# Altium footprint library Samtec PC104 Plus.PcbLib: 38 footprints (part 2 of 3)
Each footprint in its own frame and in the unit in brackets; x right, y up, seen from the top. Pads: shape width x height; smd on the part's side, far side on the other; paste and mask are expansions set on the pad; w line width, h text height; cw(c..) or ccw(c..) is an arc to the next point about the centre after c.
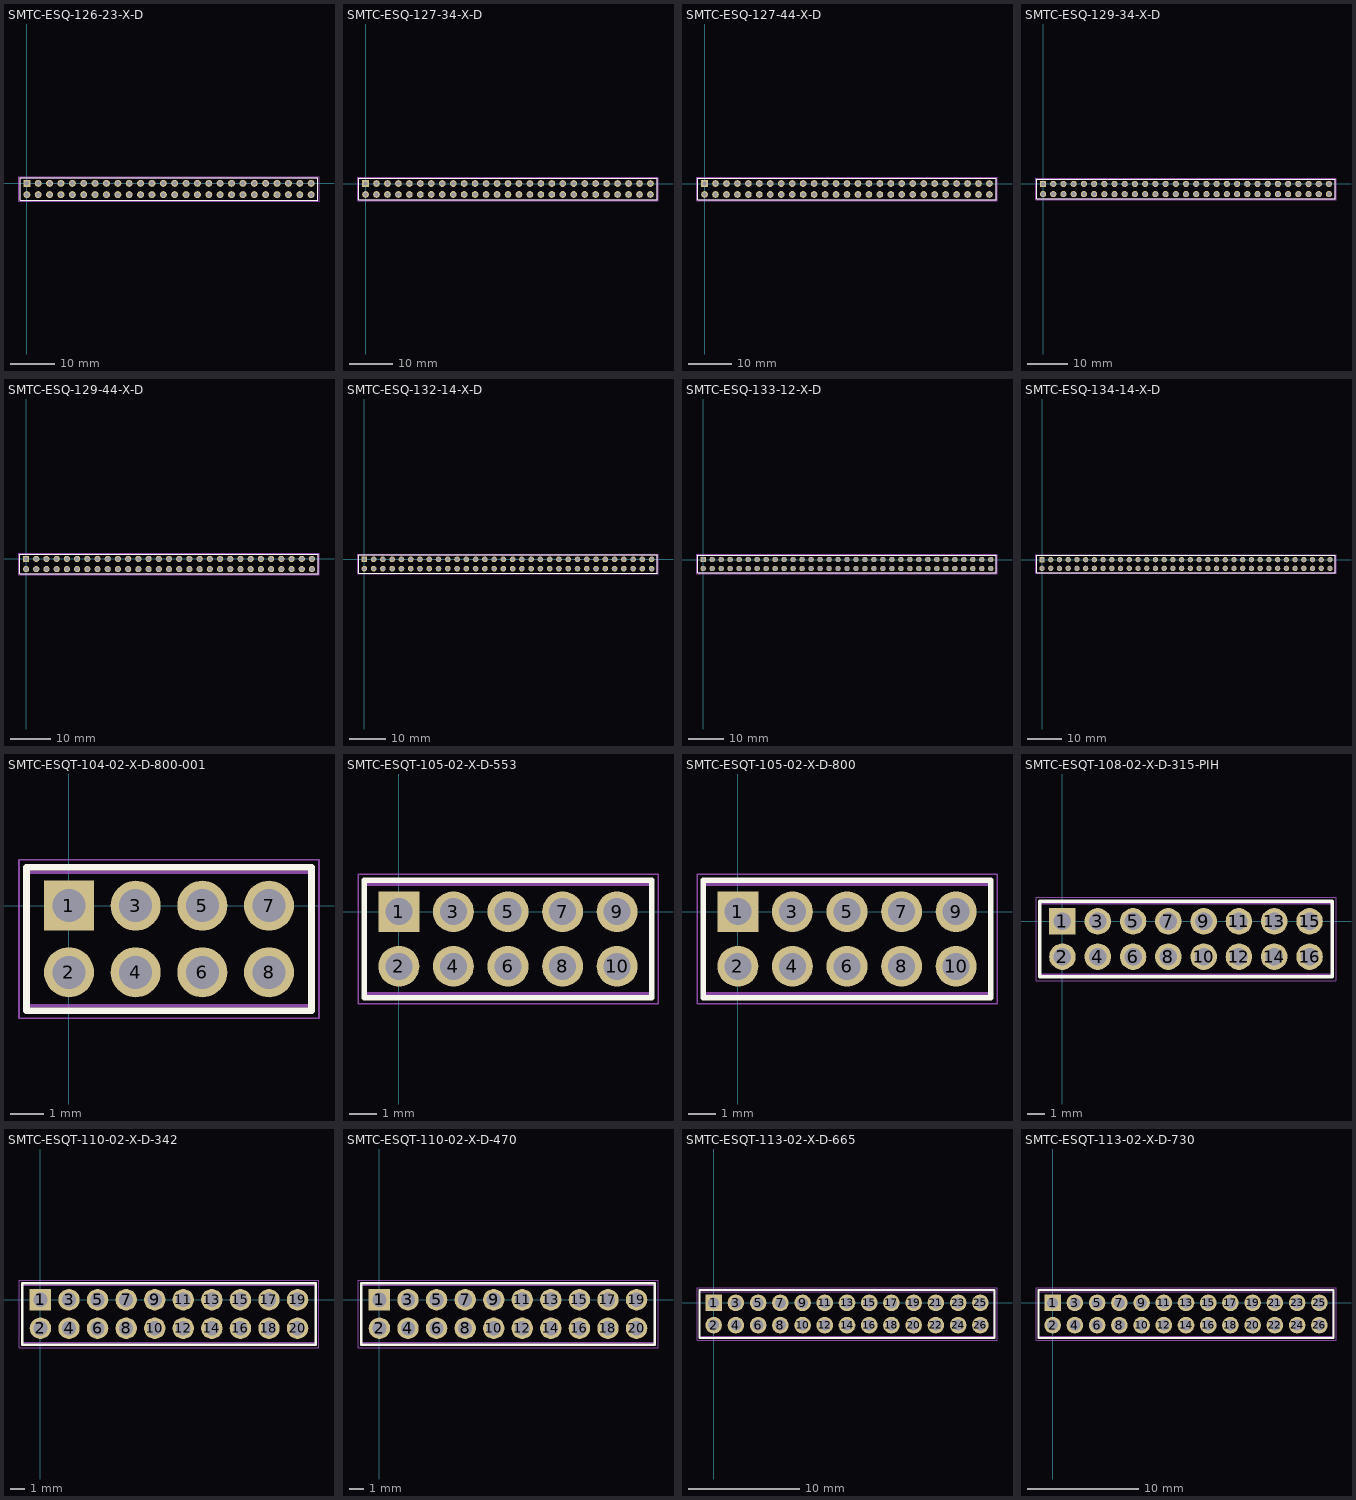
[diagram p1: the footprints below, top view; thin cyan lines are the x and y axes]

## SMTC-ESQ-126-23-X-D [mm] "Elevated Socket, 2x26 Pins, Vertical, 2.54mm Pitch, Female"
height 13.843
pads (52):
  rect 1.55x1.55 hole 1.02: 1(0,0)
  round 1.55 hole 1.02: 2(0,-2.54) 3(2.54,0) 4(2.54,-2.54) 5(5.08,0) 6(5.08,-2.54) 7(7.62,0) 8(7.62,-2.54) 9(10.16,0) 10(10.16,-2.54) 11(12.7,0) 12(12.7,-2.54) 13(15.24,0) 14(15.24,-2.54) 15(17.78,0) 16(17.78,-2.54) 17(20.32,0) 18(20.32,-2.54) 19(22.86,0) 20(22.86,-2.54) 21(25.4,0) 22(25.4,-2.54) 23(27.94,0) 24(27.94,-2.54) 25(30.48,0) 26(30.48,-2.54) 27(33.02,0) 28(33.02,-2.54) 29(35.56,0) 30(35.56,-2.54) 31(38.1,0) 32(38.1,-2.54) 33(40.64,0) 34(40.64,-2.54) 35(43.18,0) 36(43.18,-2.54) 37(45.72,0) 38(45.72,-2.54) 39(48.26,0) 40(48.26,-2.54) 41(50.8,0) 42(50.8,-2.54) 43(53.34,0) 44(53.34,-2.54) 45(55.88,0) 46(55.88,-2.54) 47(58.42,0) 48(58.42,-2.54) 49(60.96,0) 50(60.96,-2.54) 51(63.5,0) 52(63.5,-2.54)
Top Overlay:
  lines w0.2: -1.525,-3.745 65.025,-3.745 65.025,1.205 -1.525,1.205 -1.525,-3.745
Mechanical 13:
  lines w0.1: -1.525,-3.745 -1.525,1.205 65.025,1.205 65.025,-3.745 -1.525,-3.745
Mechanical 15:
  lines w0.05: -1.75,-3.97 65.25,-3.97 65.25,1.43 -1.75,1.43 -1.75,-3.97
3D body "ESQ-126-23-X-D.step": height 13.84, standoff -4.83, extent -1.525,-3.81 65.023,1.27

## SMTC-ESQ-127-34-X-D [mm] "Elevated Socket, 2x27 Pins, Vertical, 2.54mm Pitch, Female"
height 16.383
pads (54):
  rect 1.55x1.55 hole 1.02: 1(0,0)
  round 1.55 hole 1.02: 2(0,-2.54) 3(2.54,0) 4(2.54,-2.54) 5(5.08,0) 6(5.08,-2.54) 7(7.62,0) 8(7.62,-2.54) 9(10.16,0) 10(10.16,-2.54) 11(12.7,0) 12(12.7,-2.54) 13(15.24,0) 14(15.24,-2.54) 15(17.78,0) 16(17.78,-2.54) 17(20.32,0) 18(20.32,-2.54) 19(22.86,0) 20(22.86,-2.54) 21(25.4,0) 22(25.4,-2.54) 23(27.94,0) 24(27.94,-2.54) 25(30.48,0) 26(30.48,-2.54) 27(33.02,0) 28(33.02,-2.54) 29(35.56,0) 30(35.56,-2.54) 31(38.1,0) 32(38.1,-2.54) 33(40.64,0) 34(40.64,-2.54) 35(43.18,0) 36(43.18,-2.54) 37(45.72,0) 38(45.72,-2.54) 39(48.26,0) 40(48.26,-2.54) 41(50.8,0) 42(50.8,-2.54) 43(53.34,0) 44(53.34,-2.54) 45(55.88,0) 46(55.88,-2.54) 47(58.42,0) 48(58.42,-2.54) 49(60.96,0) 50(60.96,-2.54) 51(63.5,0) 52(63.5,-2.54) 53(66.04,0) 54(66.04,-2.54)
Top Overlay:
  lines w0.2: -1.525,-3.745 -1.525,1.205 67.565,1.205 67.565,-3.745 -1.525,-3.745
Mechanical 13:
  lines w0.1: -1.525,-3.745 67.565,-3.745 67.565,1.205 -1.525,1.205 -1.525,-3.745
Mechanical 15:
  lines w0.05: -1.75,-3.97 67.79,-3.97 67.79,1.43 -1.75,1.43 -1.75,-3.97
3D body "ESQ-127-34-X-D.step": height 16.38, standoff -7.11, extent -1.524,-3.81 67.564,1.27

## SMTC-ESQ-127-44-X-D [mm] "Elevated Socket, 2x27 Pins, Vertical, 2.54mm Pitch, Female"
height 18.923
pads (54):
  rect 1.55x1.55 hole 1.02: 1(0,0)
  round 1.55 hole 1.02: 2(0,-2.54) 3(2.54,0) 4(2.54,-2.54) 5(5.08,0) 6(5.08,-2.54) 7(7.62,0) 8(7.62,-2.54) 9(10.16,0) 10(10.16,-2.54) 11(12.7,0) 12(12.7,-2.54) 13(15.24,0) 14(15.24,-2.54) 15(17.78,0) 16(17.78,-2.54) 17(20.32,0) 18(20.32,-2.54) 19(22.86,0) 20(22.86,-2.54) 21(25.4,0) 22(25.4,-2.54) 23(27.94,0) 24(27.94,-2.54) 25(30.48,0) 26(30.48,-2.54) 27(33.02,0) 28(33.02,-2.54) 29(35.56,0) 30(35.56,-2.54) 31(38.1,0) 32(38.1,-2.54) 33(40.64,0) 34(40.64,-2.54) 35(43.18,0) 36(43.18,-2.54) 37(45.72,0) 38(45.72,-2.54) 39(48.26,0) 40(48.26,-2.54) 41(50.8,0) 42(50.8,-2.54) 43(53.34,0) 44(53.34,-2.54) 45(55.88,0) 46(55.88,-2.54) 47(58.42,0) 48(58.42,-2.54) 49(60.96,0) 50(60.96,-2.54) 51(63.5,0) 52(63.5,-2.54) 53(66.04,0) 54(66.04,-2.54)
Top Overlay:
  lines w0.2: -1.525,-3.745 67.565,-3.745 67.565,1.205 -1.525,1.205 -1.525,-3.745
Mechanical 13:
  lines w0.1: -1.525,-3.745 -1.525,1.205 67.565,1.205 67.565,-3.745 -1.525,-3.745
Mechanical 15:
  lines w0.05: -1.75,-3.97 -1.75,1.43 67.79,1.43 67.79,-3.97 -1.75,-3.97
3D body "ESQ-127-44-X-D.step": height 18.92, standoff -4.57, extent -1.524,-3.81 67.564,1.27

## SMTC-ESQ-129-34-X-D [mm] "Elevated Socket, 2x29 Pins, Vertical, 2.54mm Pitch, Female"
height 16.383
pads (58):
  rect 1.55x1.55 hole 1.02: 1(0,0)
  round 1.55 hole 1.02: 2(0,-2.54) 3(2.54,0) 4(2.54,-2.54) 5(5.08,0) 6(5.08,-2.54) 7(7.62,0) 8(7.62,-2.54) 9(10.16,0) 10(10.16,-2.54) 11(12.7,0) 12(12.7,-2.54) 13(15.24,0) 14(15.24,-2.54) 15(17.78,0) 16(17.78,-2.54) 17(20.32,0) 18(20.32,-2.54) 19(22.86,0) 20(22.86,-2.54) 21(25.4,0) 22(25.4,-2.54) 23(27.94,0) 24(27.94,-2.54) 25(30.48,0) 26(30.48,-2.54) 27(33.02,0) 28(33.02,-2.54) 29(35.56,0) 30(35.56,-2.54) 31(38.1,0) 32(38.1,-2.54) 33(40.64,0) 34(40.64,-2.54) 35(43.18,0) 36(43.18,-2.54) 37(45.72,0) 38(45.72,-2.54) 39(48.26,0) 40(48.26,-2.54) 41(50.8,0) 42(50.8,-2.54) 43(53.34,0) 44(53.34,-2.54) 45(55.88,0) 46(55.88,-2.54) 47(58.42,0) 48(58.42,-2.54) 49(60.96,0) 50(60.96,-2.54) 51(63.5,0) 52(63.5,-2.54) 53(66.04,0) 54(66.04,-2.54) 55(68.58,0) 56(68.58,-2.54) 57(71.12,0) 58(71.12,-2.54)
Top Overlay:
  lines w0.2: -1.525,-3.745 -1.525,1.205 72.645,1.205 72.645,-3.745 -1.525,-3.745
Mechanical 13:
  lines w0.1: -1.525,-3.745 72.645,-3.745 72.645,1.205 -1.525,1.205 -1.525,-3.745
Mechanical 15:
  lines w0.05: -1.75,-3.97 -1.75,1.43 72.87,1.43 72.87,-3.97 -1.75,-3.97
3D body "ESQ-129-34-X-D.step": height 16.38, standoff -7.11, extent -1.524,-3.81 72.644,1.27

## SMTC-ESQ-129-44-X-D [mm] "Elevated Socket, 2x29 Pins, Vertical, 2.54mm Pitch, Female"
height 18.923
pads (58):
  rect 1.55x1.55 hole 1.02: 1(0,0)
  round 1.55 hole 1.02: 2(0,-2.54) 3(2.54,0) 4(2.54,-2.54) 5(5.08,0) 6(5.08,-2.54) 7(7.62,0) 8(7.62,-2.54) 9(10.16,0) 10(10.16,-2.54) 11(12.7,0) 12(12.7,-2.54) 13(15.24,0) 14(15.24,-2.54) 15(17.78,0) 16(17.78,-2.54) 17(20.32,0) 18(20.32,-2.54) 19(22.86,0) 20(22.86,-2.54) 21(25.4,0) 22(25.4,-2.54) 23(27.94,0) 24(27.94,-2.54) 25(30.48,0) 26(30.48,-2.54) 27(33.02,0) 28(33.02,-2.54) 29(35.56,0) 30(35.56,-2.54) 31(38.1,0) 32(38.1,-2.54) 33(40.64,0) 34(40.64,-2.54) 35(43.18,0) 36(43.18,-2.54) 37(45.72,0) 38(45.72,-2.54) 39(48.26,0) 40(48.26,-2.54) 41(50.8,0) 42(50.8,-2.54) 43(53.34,0) 44(53.34,-2.54) 45(55.88,0) 46(55.88,-2.54) 47(58.42,0) 48(58.42,-2.54) 49(60.96,0) 50(60.96,-2.54) 51(63.5,0) 52(63.5,-2.54) 53(66.04,0) 54(66.04,-2.54) 55(68.58,0) 56(68.58,-2.54) 57(71.12,0) 58(71.12,-2.54)
Top Overlay:
  lines w0.2: -1.525,-3.745 72.645,-3.745 72.645,1.205 -1.525,1.205 -1.525,-3.745
Mechanical 13:
  lines w0.1: -1.525,-3.745 -1.525,1.205 72.645,1.205 72.645,-3.745 -1.525,-3.745
Mechanical 15:
  lines w0.05: -1.75,-3.97 -1.75,1.43 72.87,1.43 72.87,-3.97 -1.75,-3.97
3D body "ESQ-129-44-X-D.step": height 18.92, standoff -4.57, extent -1.524,-3.81 72.644,1.27

## SMTC-ESQ-132-14-X-D [mm] "Elevated Socket, 2x32 Pins, Vertical, 2.54mm Pitch, Female"
height 11.303
pads (64):
  rect 1.55x1.55 hole 1.02: 1(0,0)
  round 1.55 hole 1.02: 2(0,-2.54) 3(2.54,0) 4(2.54,-2.54) 5(5.08,0) 6(5.08,-2.54) 7(7.62,0) 8(7.62,-2.54) 9(10.16,0) 10(10.16,-2.54) 11(12.7,0) 12(12.7,-2.54) 13(15.24,0) 14(15.24,-2.54) 15(17.78,0) 16(17.78,-2.54) 17(20.32,0) 18(20.32,-2.54) 19(22.86,0) 20(22.86,-2.54) 21(25.4,0) 22(25.4,-2.54) 23(27.94,0) 24(27.94,-2.54) 25(30.48,0) 26(30.48,-2.54) 27(33.02,0) 28(33.02,-2.54) 29(35.56,0) 30(35.56,-2.54) 31(38.1,0) 32(38.1,-2.54) 33(40.64,0) 34(40.64,-2.54) 35(43.18,0) 36(43.18,-2.54) 37(45.72,0) 38(45.72,-2.54) 39(48.26,0) 40(48.26,-2.54) 41(50.8,0) 42(50.8,-2.54) 43(53.34,0) 44(53.34,-2.54) 45(55.88,0) 46(55.88,-2.54) 47(58.42,0) 48(58.42,-2.54) 49(60.96,0) 50(60.96,-2.54) 51(63.5,0) 52(63.5,-2.54) 53(66.04,0) 54(66.04,-2.54) 55(68.58,0) 56(68.58,-2.54) 57(71.12,0) 58(71.12,-2.54) 59(73.66,0) 60(73.66,-2.54) 61(76.2,0) 62(76.2,-2.54) 63(78.74,0) 64(78.74,-2.54)
Top Overlay:
  lines w0.2: -1.525,-3.745 -1.525,1.205 80.265,1.205 80.265,-3.745 -1.525,-3.745
Mechanical 13:
  lines w0.1: -1.525,-3.745 -1.525,1.205 80.265,1.205 80.265,-3.745 -1.525,-3.745
Mechanical 15:
  lines w0.05: -1.75,-3.97 80.49,-3.97 80.49,1.43 -1.75,1.43 -1.75,-3.97
3D body "ESQ-132-14-X-D.step": height 11.3, standoff -12.19, extent -1.524,-3.81 80.264,1.27

## SMTC-ESQ-133-12-X-D [mm] "Elevated Socket, 2x33 Pins, Vertical, 2.54mm Pitch, Female"
height 11.303
pads (66):
  rect 1.55x1.55 hole 1.02: 1(0,0)
  round 1.55 hole 1.02: 2(0,-2.54) 3(2.54,0) 4(2.54,-2.54) 5(5.08,0) 6(5.08,-2.54) 7(7.62,0) 8(7.62,-2.54) 9(10.16,0) 10(10.16,-2.54) 11(12.7,0) 12(12.7,-2.54) 13(15.24,0) 14(15.24,-2.54) 15(17.78,0) 16(17.78,-2.54) 17(20.32,0) 18(20.32,-2.54) 19(22.86,0) 20(22.86,-2.54) 21(25.4,0) 22(25.4,-2.54) 23(27.94,0) 24(27.94,-2.54) 25(30.48,0) 26(30.48,-2.54) 27(33.02,0) 28(33.02,-2.54) 29(35.56,0) 30(35.56,-2.54) 31(38.1,0) 32(38.1,-2.54) 33(40.64,0) 34(40.64,-2.54) 35(43.18,0) 36(43.18,-2.54) 37(45.72,0) 38(45.72,-2.54) 39(48.26,0) 40(48.26,-2.54) 41(50.8,0) 42(50.8,-2.54) 43(53.34,0) 44(53.34,-2.54) 45(55.88,0) 46(55.88,-2.54) 47(58.42,0) 48(58.42,-2.54) 49(60.96,0) 50(60.96,-2.54) 51(63.5,0) 52(63.5,-2.54) 53(66.04,0) 54(66.04,-2.54) 55(68.58,0) 56(68.58,-2.54) 57(71.12,0) 58(71.12,-2.54) 59(73.66,0) 60(73.66,-2.54) 61(76.2,0) 62(76.2,-2.54) 63(78.74,0) 64(78.74,-2.54) 65(81.28,0) 66(81.28,-2.54)
Top Overlay:
  lines w0.2: -1.525,-3.745 82.805,-3.745 82.805,1.205 -1.525,1.205 -1.525,-3.745
Mechanical 13:
  lines w0.1: -1.525,-3.745 82.805,-3.745 82.805,1.205 -1.525,1.205 -1.525,-3.745
Mechanical 15:
  lines w0.05: -1.75,-3.97 83.03,-3.97 83.03,1.43 -1.75,1.43 -1.75,-3.97
3D body "ESQ-133-12-X-D.step": height 11.3, standoff -2.29, extent -1.525,-3.81 82.803,1.27

## SMTC-ESQ-134-14-X-D [mm] "Elevated Socket, 2x34 Pins, Vertical, 2.54mm Pitch, Female"
height 11.303
pads (68):
  rect 1.55x1.55 hole 1.02: 1(0,0)
  round 1.55 hole 1.02: 2(0,-2.54) 3(2.54,0) 4(2.54,-2.54) 5(5.08,0) 6(5.08,-2.54) 7(7.62,0) 8(7.62,-2.54) 9(10.16,0) 10(10.16,-2.54) 11(12.7,0) 12(12.7,-2.54) 13(15.24,0) 14(15.24,-2.54) 15(17.78,0) 16(17.78,-2.54) 17(20.32,0) 18(20.32,-2.54) 19(22.86,0) 20(22.86,-2.54) 21(25.4,0) 22(25.4,-2.54) 23(27.94,0) 24(27.94,-2.54) 25(30.48,0) 26(30.48,-2.54) 27(33.02,0) 28(33.02,-2.54) 29(35.56,0) 30(35.56,-2.54) 31(38.1,0) 32(38.1,-2.54) 33(40.64,0) 34(40.64,-2.54) 35(43.18,0) 36(43.18,-2.54) 37(45.72,0) 38(45.72,-2.54) 39(48.26,0) 40(48.26,-2.54) 41(50.8,0) 42(50.8,-2.54) 43(53.34,0) 44(53.34,-2.54) 45(55.88,0) 46(55.88,-2.54) 47(58.42,0) 48(58.42,-2.54) 49(60.96,0) 50(60.96,-2.54) 51(63.5,0) 52(63.5,-2.54) 53(66.04,0) 54(66.04,-2.54) 55(68.58,0) 56(68.58,-2.54) 57(71.12,0) 58(71.12,-2.54) 59(73.66,0) 60(73.66,-2.54) 61(76.2,0) 62(76.2,-2.54) 63(78.74,0) 64(78.74,-2.54) 65(81.28,0) 66(81.28,-2.54) 67(83.82,0) 68(83.82,-2.54)
Top Overlay:
  lines w0.2: -1.525,-3.745 85.345,-3.745 85.345,1.205 -1.525,1.205 -1.525,-3.745
Mechanical 13:
  lines w0.1: -1.525,-3.745 85.345,-3.745 85.345,1.205 -1.525,1.205 -1.525,-3.745
Mechanical 15:
  lines w0.05: -1.75,-3.97 85.57,-3.97 85.57,1.43 -1.75,1.43 -1.75,-3.97
3D body "ESQ-134-14-X-D.step": height 11.3, standoff -12.19, extent -1.524,-3.81 85.344,1.27

## SMTC-ESQT-104-02-X-D-800-001 [mm] "Flexible Elevated Socket, 2x4 Pins, Vertical, 2mm Pitch, Female"
height 20.32
pads (8):
  rect 1.5x1.5 hole 0.99: 1(0,0)
  round 1.5 hole 0.99: 2(0,-2) 3(2,0) 4(2,-2) 5(4,0) 6(4,-2) 7(6,0) 8(6,-2)
Top Overlay:
  lines w0.2: -1.275,-3.15 7.275,-3.15 7.275,1.15 -1.275,1.15 -1.275,-3.15
Mechanical 13:
  lines w0.1: -1.275,-3 7.275,-3 7.275,1 -1.275,1 -1.275,-3
Mechanical 15:
  lines w0.05: -1.5,-3.375 7.5,-3.375 7.5,1.375 -1.5,1.375 -1.5,-3.375
3D body "ESQT-104-02-X-D-800-001.step": height 20.32, standoff -1.27, extent -1.149,-3 7.149,1

## SMTC-ESQT-105-02-X-D-553 [mm] "Flexible Elevated Socket, 2x5 Pins, Vertical, 2mm Pitch, Female"
height 20.32
pads (10):
  rect 1.5x1.5 hole 0.99: 1(0,0)
  round 1.5 hole 0.99: 2(0,-2) 3(2,0) 4(2,-2) 5(4,0) 6(4,-2) 7(6,0) 8(6,-2) 9(8,0) 10(8,-2)
Top Overlay:
  lines w0.2: -1.275,-3.15 9.275,-3.15 9.275,1.15 -1.275,1.15 -1.275,-3.15
Mechanical 13:
  lines w0.1: -1.275,-3 9.275,-3 9.275,1 -1.275,1 -1.275,-3
Mechanical 15:
  lines w0.05: -1.5,-3.375 -1.5,1.375 9.5,1.375 9.5,-3.375 -1.5,-3.375
3D body "ESQT-105-02-X-D-553.step": height 20.32, standoff -7.54, extent -1.149,-3 9.149,1

## SMTC-ESQT-105-02-X-D-800 [mm] "Flexible Elevated Socket, 2x5 Pins, Vertical, 2mm Pitch, Female"
height 20.32
pads (10):
  rect 1.5x1.5 hole 0.99: 1(0,0)
  round 1.5 hole 0.99: 2(0,-2) 3(2,0) 4(2,-2) 5(4,0) 6(4,-2) 7(6,0) 8(6,-2) 9(8,0) 10(8,-2)
Top Overlay:
  lines w0.2: -1.275,-3.15 9.275,-3.15 9.275,1.15 -1.275,1.15 -1.275,-3.15
Mechanical 13:
  lines w0.1: -1.275,-3 9.275,-3 9.275,1 -1.275,1 -1.275,-3
Mechanical 15:
  lines w0.05: -1.5,-3.375 9.5,-3.375 9.5,1.375 -1.5,1.375 -1.5,-3.375
3D body "ESQT-105-02-X-D-800.step": height 20.32, standoff -1.27, extent -1.149,-3 9.149,1

## SMTC-ESQT-108-02-X-D-315-PIH [mm] "Flexible Elevated Socket, 2x8 Pins, Vertical, 2mm Pitch, Female"
height 20.32
pads (16):
  rect 1.5x1.5 hole 0.99: 1(0,0)
  round 1.5 hole 0.99: 2(0,-2) 3(2,0) 4(2,-2) 5(4,0) 6(4,-2) 7(6,0) 8(6,-2) 9(8,0) 10(8,-2) 11(10,0) 12(10,-2) 13(12,0) 14(12,-2) 15(14,0) 16(14,-2)
Top Overlay:
  lines w0.2: -1.275,-3.15 -1.275,1.15 15.275,1.15 15.275,-3.15 -1.275,-3.15
Mechanical 13:
  lines w0.1: -1.275,-3 15.275,-3 15.275,1 -1.275,1 -1.275,-3
Mechanical 15:
  lines w0.05: -1.5,-3.375 -1.5,1.375 ; -1.475,-3.375 15.475,-3.375 ; -1.475,1.375 15.475,1.375 ; 15.5,-3.375 15.5,1.375
3D body "ESQT-108-02-X-D-315-PIH.step": height 20.32, standoff -13.59, extent -1.149,-3 15.149,1

## SMTC-ESQT-110-02-X-D-342 [mm] "Flexible Elevated Socket, 2x10 Pins, Vertical, 2mm Pitch, Female"
height 20.32
pads (20):
  rect 1.5x1.5 hole 0.99: 1(0,0)
  round 1.5 hole 0.99: 2(0,-2) 3(2,0) 4(2,-2) 5(4,0) 6(4,-2) 7(6,0) 8(6,-2) 9(8,0) 10(8,-2) 11(10,0) 12(10,-2) 13(12,0) 14(12,-2) 15(14,0) 16(14,-2) 17(16,0) 18(16,-2) 19(18,0) 20(18,-2)
Top Overlay:
  lines w0.2: -1.275,-3.15 19.275,-3.15 19.275,1.15 -1.275,1.15 -1.275,-3.15
Mechanical 13:
  lines w0.1: -1.275,-3 19.275,-3 19.275,1 -1.275,1 -1.275,-3
Mechanical 15:
  lines w0.05: -1.5,-3.375 -1.5,1.375 19.5,1.375 19.5,-3.375 -1.5,-3.375
3D body "ESQT-110-02-X-D-342.step": height 20.32, standoff -12.9, extent -1.149,-2.968 19.149,1.032

## SMTC-ESQT-110-02-X-D-470 [mm] "Flexible Elevated Socket, 2x10 Pins, Vertical, 2mm Pitch, Female"
height 20.32
pads (20):
  rect 1.5x1.5 hole 0.99: 1(0,0)
  round 1.5 hole 0.99: 2(0,-2) 3(2,0) 4(2,-2) 5(4,0) 6(4,-2) 7(6,0) 8(6,-2) 9(8,0) 10(8,-2) 11(10,0) 12(10,-2) 13(12,0) 14(12,-2) 15(14,0) 16(14,-2) 17(16,0) 18(16,-2) 19(18,0) 20(18,-2)
Top Overlay:
  lines w0.2: -1.275,-3.15 19.275,-3.15 19.275,1.15 -1.275,1.15 -1.275,-3.15
Mechanical 13:
  lines w0.1: -1.275,-3 19.275,-3 19.275,1 -1.275,1 -1.275,-3
Mechanical 15:
  lines w0.05: -1.5,-3.375 19.5,-3.375 19.5,1.375 -1.5,1.375 -1.5,-3.375
3D body "ESQT-110-02-X-D-470.step": height 20.32, standoff -9.65, extent -1.149,-3 19.149,1

## SMTC-ESQT-113-02-X-D-665 [mm] "Flexible Elevated Socket, 2x13 Pins, Vertical, 2mm Pitch, Female"
height 20.32
pads (26):
  rect 1.5x1.5 hole 0.99: 1(0,0)
  round 1.5 hole 0.99: 2(0,-2) 3(2,0) 4(2,-2) 5(4,0) 6(4,-2) 7(6,0) 8(6,-2) 9(8,0) 10(8,-2) 11(10,0) 12(10,-2) 13(12,0) 14(12,-2) 15(14,0) 16(14,-2) 17(16,0) 18(16,-2) 19(18,0) 20(18,-2) 21(20,0) 22(20,-2) 23(22,0) 24(22,-2) 25(24,0) 26(24,-2)
Top Overlay:
  lines w0.2: -1.275,-3.15 25.275,-3.15 25.275,1.15 -1.275,1.15 -1.275,-3.15
Mechanical 13:
  lines w0.1: -1.275,-3 25.275,-3 25.275,1 -1.275,1 -1.275,-3
Mechanical 15:
  lines w0.05: -1.5,-3.375 25.5,-3.375 25.5,1.375 -1.5,1.375 -1.5,-3.375
3D body "ESQT-113-02-X-D-665.step": height 20.32, standoff -4.7, extent -1.149,-3 25.149,1

## SMTC-ESQT-113-02-X-D-730 [mm] "Flexible Elevated Socket, 2x13 Pins, Vertical, 2mm Pitch, Female"
height 20.32
pads (26):
  rect 1.5x1.5 hole 0.99: 1(0,0)
  round 1.5 hole 0.99: 2(0,-2) 3(2,0) 4(2,-2) 5(4,0) 6(4,-2) 7(6,0) 8(6,-2) 9(8,0) 10(8,-2) 11(10,0) 12(10,-2) 13(12,0) 14(12,-2) 15(14,0) 16(14,-2) 17(16,0) 18(16,-2) 19(18,0) 20(18,-2) 21(20,0) 22(20,-2) 23(22,0) 24(22,-2) 25(24,0) 26(24,-2)
Top Overlay:
  lines w0.2: -1.275,-3.15 -1.275,1.15 25.275,1.15 25.275,-3.15 -1.275,-3.15
Mechanical 13:
  lines w0.1: -1.275,-3 -1.275,1 25.275,1 25.275,-3 -1.275,-3
Mechanical 15:
  lines w0.05: -1.5,-3.375 -1.5,1.375 25.5,1.375 25.5,-3.375 -1.5,-3.375
3D body "ESQT-113-02-X-D-730.step": height 20.32, standoff -3.05, extent -1.149,-3 25.149,1